# Altium footprint library Indruino.PcbLib: 383 footprints (part 18 of 24)
Each footprint in its own frame and in the unit in brackets; x right, y up, seen from the top. Pads: shape width x height; smd on the part's side, far side on the other; paste and mask are expansions set on the pad; w line width, h text height; cw(c..) or ccw(c..) is an arc to the next point about the centre after c.
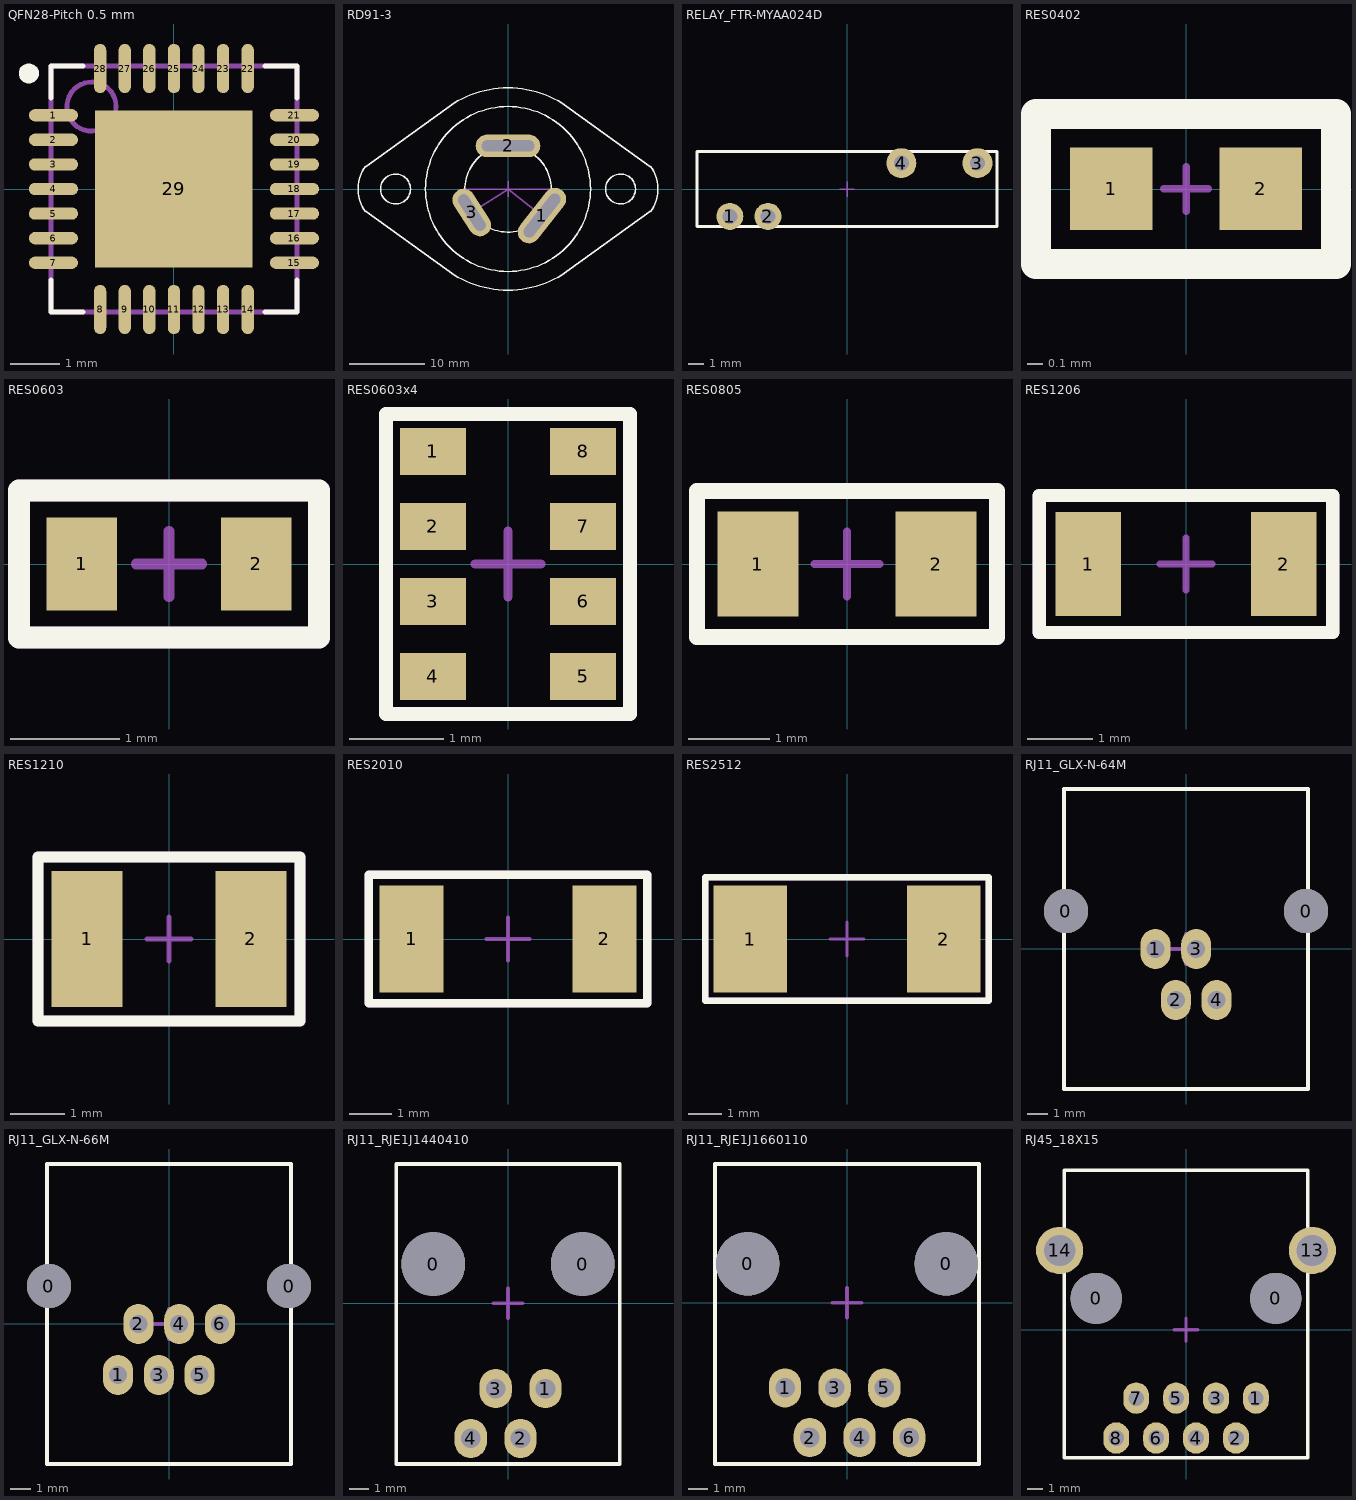
[diagram p17: the footprints below, top view; thin cyan lines are the x and y axes]

## QFN28-Pitch 0.5 mm [mm]
pads (29):
  oval 1x0.25 smd: 1(-2.45,1.5) 2(-2.45,1) 3(-2.45,0.5) 4(-2.45,0) 5(-2.45,-0.5) 6(-2.45,-1) 7(-2.45,-1.5) 15(2.45,-1.5) 16(2.45,-1) 17(2.45,-0.5) 18(2.45,0) 19(2.45,0.5) 20(2.45,1) 21(2.45,1.5)
  oval 0.25x1 smd: 8(-1.5,-2.45) 9(-1,-2.45) 10(-0.5,-2.45) 11(0,-2.45) 12(0.5,-2.45) 13(1,-2.45) 14(1.5,-2.45) 22(1.5,2.45) 23(1,2.45) 24(0.5,2.45) 25(0,2.45) 26(-0.5,2.45) 27(-1,2.45) 28(-1.5,2.45)
  rect 3.2x3.2 smd: 29(0,0)
Top Overlay:
  region: -2.95,2.15 -2.99,2.15 -3.063,2.18 -3.12,2.237 -3.15,2.31 -3.15,2.35 -3.15,2.39 -3.12,2.463 -3.063,2.52 -2.99,2.55 -2.95,2.55 -2.91,2.55 -2.837,2.52 -2.78,2.463 -2.75,2.39 -2.75,2.35 -2.75,2.31 -2.78,2.237 -2.837,2.18 -2.91,2.15
  lines w0.1: -2.5,-1.85 -2.5,-2.5 -1.85,-2.5 ; -2.5,1.85 -2.5,2.5 -1.85,2.5 ; 1.85,-2.5 2.5,-2.5 2.5,-1.85 ; 1.85,2.5 2.5,2.5 2.5,1.85
Mechanical 13:
  circle w0.1: c-1.675,1.675 r0.5
  lines w0.1: -2.5,-2.5 -2.5,2.5 2.5,2.5 2.5,-2.5 -2.5,-2.5
Mechanical 15:
  lines w0.1: -0.5,0 0.5,0 ; 0,-0.5 0,0.5
3D body "User Library-QFN28-0_5.STEP": height 1, standoff 0, extent -2.5,-2.5 2.5,2.5

## RD91-3 [mm]
pads (3):
  oval 3x8.6 hole 7 slot 1.5 at 142 deg rot 142: 1(4.531,-3.54)
  oval 8.6x3 hole 7 slot 1.5 at 90 deg: 2(0,5.75)
  oval 3x7 hole 5.5 slot 1.5 at 33 deg rot 33: 3(-4.822,-3.132)
Top Overlay:
  circle w0.2: c0,0 r5.75
  circle w0.2: c-15,0 r2
  circle w0.2: c15,0 r2
  circle w0.2: c0,0 r11
  lines w0.2: -19,-3 cw(c-15,0) -19,3 -8.255,10.682 cw(c0,0) 8.255,10.682 19,3 cw(c15,0) 19,-3 8.255,-10.682 cw(c0,0) -8.255,-10.682 -19,-3
Mechanical 1:
  lines w0.2: 0,0 5.75,0 cw(c0,0) 4.531,-3.54 0,0 ; 0,0 -5.75,0 ccw(c0,0) -4.822,-3.132 0,0
Mechanical 15:
  lines w0.2: -1,0 1,0 ; 0,-1 0,1
3D body "BTA40600B Triac.STEP": height 5.6, standoff -17.9, extent -20,-13.493 20,13.493

## RELAY_FTR-MYAA024D [mm]
pads (4):
  round 1.8 hole 1: 1(-7.81,-1.82) 2(-5.27,-1.82)
  round 2 hole 1: 3(8.7,1.73) 4(3.62,1.73)
Top Overlay:
  lines w0.2: -10,-2.5 -10,2.5 10,2.5 10,-2.5 -10,-2.5
Mechanical 15:
  lines w0.1: -0.5,0 0.5,0 ; 0,-0.5 0,0.5
3D body: height 12, standoff 0, extent -10,-2.5 10,2.5

## RES0402 [mm]
pads (2):
  rect 0.55x0.55 smd: 1(-0.5,0) 2(0.5,0)
Top Overlay:
  lines w0.2: -1,-0.5 1,-0.5 1,0.5 -1,0.5 -1,-0.5
Mechanical 13:
  lines w0.2: -1,-0.5 1,-0.5 1,0.5 -1,0.5 -1,-0.5
  text "'.Designator'" at -0.7,-0.233 h0.5
Mechanical 15:
  lines w0.05: -0.15,0 0.15,0 ; 0,-0.15 0,0.15
3D body "User Library-RESC1005X04N.STEP": height 0.35, standoff 0, extent -0.5,-0.25 0.5,0.25

## RES0603 [mm]
pads (2):
  rect 0.65x0.85 smd: 1(-0.8,0) 2(0.8,0)
Top Overlay:
  lines w0.2: -1.375,-0.675 1.375,-0.675 1.375,0.675 -1.375,0.675 -1.375,-0.675
Mechanical 13:
  lines w0.2: -1.375,-0.675 1.375,-0.675 1.375,0.675 -1.375,0.675 -1.375,-0.675
  text "'.Designator'" at -1.03,-0.397 h0.7
Mechanical 15:
  lines w0.1: -0.3,0 0.3,0 ; 0,-0.3 0,0.3
3D body "User Library-RESC1608X05N.STEP": height 0.45, standoff 0, extent -0.785,-0.425 0.765,0.425

## RES0603x4 [mm] "Chip Resistor, Body 1.6x0.8mm, IPC High Density"
height 0.6
pads (8):
  rect 0.7x0.5 smd: 1(-0.8,1.2) 2(-0.8,0.4) 3(-0.8,-0.4) 4(-0.8,-1.2) 5(0.8,-1.2) 6(0.8,-0.4) 7(0.8,0.4) 8(0.8,1.2)
Top Overlay:
  lines w0.15: -1.3,-1.6 1.3,-1.6 1.3,1.6 -1.3,1.6 -1.3,-1.6
Mechanical 13:
  lines w0.1: -1.3,-1.6 1.3,-1.6 1.3,1.6 -1.3,1.6 -1.3,-1.6
Mechanical 15:
  lines w0.1: -0.35,0 0.35,0 ; 0,-0.35 0,0.35
3D body "User Library-Array-1206-4Way-Var2-1.STEP": height 0.5, standoff 0, extent -0.8,-1.6 0.8,1.6

## RES0805 [mm]
pads (2):
  rect 1x1.3 smd: 1(-1.1,0) 2(1.1,0)
Top Overlay:
  lines w0.2: -1.85,-0.9 -1.85,0.9 1.85,0.9 1.85,-0.9 -1.85,-0.9
Mechanical 13:
  lines w0.2: -1.85,-0.9 1.85,-0.9 1.85,0.9 -1.85,0.9 -1.85,-0.9
  text "'.Designator'" at -1.475,-0.458 h0.8
Mechanical 15:
  lines w0.1: -0.4,0 0.4,0 ; 0,-0.4 0,0.4
3D body "User Library-RESC2012X05N.STEP": height 0.45, standoff 0, extent -0.995,-0.625 1.005,0.625

## RES1206 [mm]
pads (2):
  rect 1x1.6 smd: 1(-1.5,0) 2(1.5,0)
Top Overlay:
  lines w0.2: -2.25,-1.05 -2.25,1.05 2.25,1.05 2.25,-1.05 -2.25,-1.05
Mechanical 13:
  lines w0.2: -2.25,-1.05 -2.25,1.05 2.25,1.05 2.25,-1.05 -2.25,-1.05
  text "'.Designator'" at -1.8,-0.383 h0.8
Mechanical 15:
  lines w0.1: -0.4,0 0.4,0 ; 0,-0.4 0,0.4
3D body "User Library-RESC3216X06N.STEP": height 0.55, standoff 0, extent -1.615,-0.8 1.585,0.8

## RES1210 [mm]
pads (2):
  rect 1.3x2.5 smd: 1(-1.5,0) 2(1.5,0)
Top Overlay:
  lines w0.2: -2.4,-1.5 -2.4,1.5 2.4,1.5 2.4,-1.5 -2.4,-1.5
Mechanical 13:
  lines w0.2: -2.4,-1.5 -2.4,1.5 2.4,1.5 2.4,-1.5 -2.4,-1.5
  text "'.Designator'" at -1.95,-0.333 h0.8
Mechanical 15:
  lines w0.1: -0.4,0 0.4,0 ; 0,-0.4 0,0.4
3D body "User Library-RESC3225X06N.STEP": height 0.55, standoff 0, extent -1.6,-1.25 1.6,1.25

## RES2010 [mm]
pads (2):
  rect 1.5x2.5 smd: 1(-2.25,0) 2(2.25,0)
Top Overlay:
  lines w0.2: -3.25,-1.5 -3.25,1.5 3.25,1.5 3.25,-1.5 -3.25,-1.5
Mechanical 13:
  lines w0.2: -3.25,-1.5 -3.25,1.5 3.25,1.5 3.25,-1.5 -3.25,-1.5
  text "'.Designator'" at -2.8,-0.333 h0.8
Mechanical 15:
  lines w0.1: -0.5,0 0.5,0 ; 0,-0.5 0,0.5
3D body "User Library-CRS2010.step": height 0.56, standoff 0, extent -2.5,-1.25 2.5,1.25

## RES2512 [mm]
pads (2):
  rect 2.2x3.2 smd: 1(-2.9,0) 2(2.9,0)
Top Overlay:
  lines w0.2: -4.25,-1.85 4.25,-1.85 4.25,1.85 -4.25,1.85 -4.25,-1.85
Mechanical 13:
  lines w0.2: -4.25,-1.85 4.25,-1.85 4.25,1.85 -4.25,1.85 -4.25,-1.85
  text "'.Designator'" at -3.75,-0.333 h0.8
Mechanical 15:
  lines w0.1: -0.5,0 0.5,0 ; 0,-0.5 0,0.5
3D body "User Library-RESC6432X06.STEP": height 0.6, standoff 0, extent -3.2,-1.6 3.2,1.6

## RJ11_GLX-N-64M [mm] "CONN MOD JACK 6P4C R/A UNSHLD"
pads (6):
  round 2.2 hole 2.2: 0(-6,1.9) 0(6,1.9)
  oval 1.5x2 hole 0.9: 1(-1.53,0) 2(-0.51,-2.55) 3(0.51,0) 4(1.53,-2.55)
Top Overlay:
  lines w0.2: -6.1,-7 -6.1,8 6.1,8 6.1,-7 -6.1,-7
Mechanical 15:
  lines w0.2: -0.75,0 0.75,0 ; 0,-0.75 0,0.75
3D body "GLX-N-64_rA5.STEP": height 14.4, standoff -3.25, extent -7.2,-7 7.2,8

## RJ11_GLX-N-66M [mm] "CONN MOD JACK 6P6C R/A UNSHLD"
pads (8):
  round 2.2 hole 2.2: 0(-6,1.9) 0(6,1.9)
  oval 1.5x2 hole 0.9: 1(-2.55,-2.55) 2(-1.53,0) 3(-0.51,-2.55) 4(0.51,0) 5(1.53,-2.55) 6(2.55,0)
Top Overlay:
  lines w0.2: -6.1,-7 6.1,-7 6.1,8 -6.1,8 -6.1,-7
Mechanical 15:
  lines w0.2: -0.75,0 0.75,0 ; 0,-0.75 0,0.75
3D body "GLX-N-66_rA5.STEP": height 14.4, standoff -3.25, extent -7.2,-7 7.2,8

## RJ11_RJE1J1440410 [mm] "Modular Jack - Verticals, Input Output Connectors 4P4C, Without Shield, Without LEDs."
pads (6):
  round 3.25 hole 3.25: 0(-3.81,1.995) 0(3.81,1.995)
  oval 1.65x2 hole 1: 1(1.91,-4.355) 2(0.64,-6.895) 3(-0.63,-4.355) 4(-1.9,-6.895)
Top Overlay:
  lines w0.2: -5.7,-8.2 -5.7,7.1 5.7,7.1 5.7,-8.2 -5.7,-8.2
Mechanical 15:
  lines w0.2: -0.75,0 0.75,0 ; 0,-0.75 0,0.75
3D body "RJE1J_1P_0001.step": height 15.5, standoff -3.5, extent -5.59,-8.115 5.59,6.965

## RJ11_RJE1J1660110 [mm] "Modular Jack - Verticals, Input Output Connectors 6P6C, Without Shield, Without LEDs."
pads (8):
  round 3.25 hole 3.25: 0(-5.08,1.995) 0(5.08,1.995)
  oval 1.65x2 hole 1: 1(-3.17,-4.355) 2(-1.9,-6.895) 3(-0.63,-4.355) 4(0.64,-6.895) 5(1.91,-4.355) 6(3.18,-6.895)
Top Overlay:
  lines w0.2: -6.75,-8.25 -6.75,7.1 6.75,7.1 6.75,-8.25 -6.75,-8.25
Mechanical 15:
  lines w0.2: -0.75,0 0.75,0 ; 0,-0.75 0,0.75
3D body "M-RJE1J-166-0X10-REVT1.STEP": height 15.5, standoff -3.5, extent -6.605,-8.15 6.605,6.93

## RJ45_18X15 [mm] "Jack Modular Connector 8p8c (RJ45, Ethernet) Vertical Unshielded"
pads (12):
  round 3.25 hole 3.25: 0(-5.715,1.995) 0(5.715,1.995)
  oval 1.65x2 hole 1: 1(4.45,-4.355) 2(3.18,-6.895) 3(1.91,-4.355) 4(0.64,-6.895) 5(-0.63,-4.355) 6(-1.9,-6.895) 7(-3.17,-4.355) 8(-4.44,-6.895)
  round 3 hole 2: 13(8.05,5.045) 14(-8.05,5.045)
Top Overlay:
  lines w0.2: -7.75,-8.15 -7.75,10.15 7.75,10.15 7.75,-8.15 -7.75,-8.15
Mechanical 15:
  lines w0.2: -0.75,0 0.75,0 ; 0,-0.75 0,0.75
3D body "ACC-M-FRJAE-418-REVT1.step": height 14.11, standoff -3.71, extent -7.695,-8.534 7.694,10.135